# Altium footprint library Connectors.PcbLib: 268 footprints (part 3 of 21)
Each footprint in its own frame and in the unit in brackets; x right, y up, seen from the top. Pads: shape width x height; smd on the part's side, far side on the other; paste and mask are expansions set on the pad; w line width, h text height; cw(c..) or ccw(c..) is an arc to the next point about the centre after c.
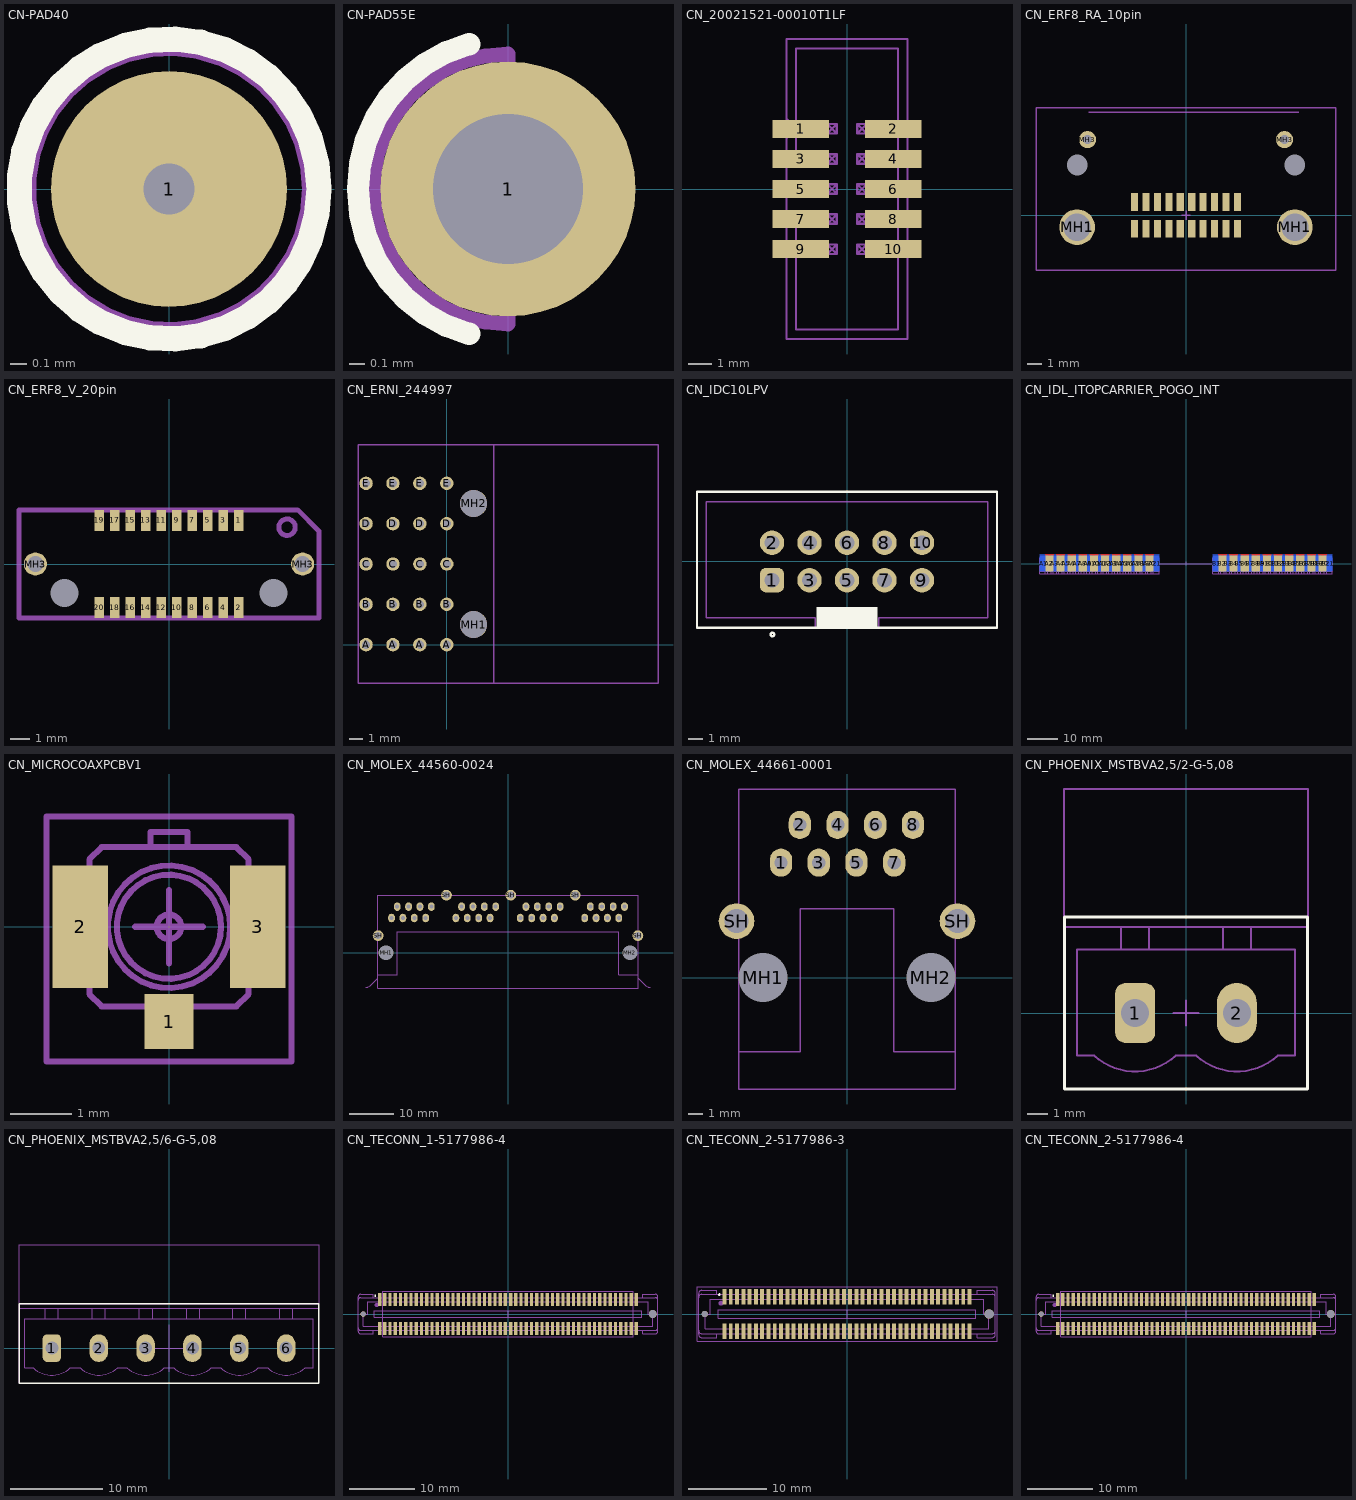
[diagram p2: the footprints below, top view; thin cyan lines are the x and y axes]

## CN-PAD40 [mil] "Connector pad 1.0mm with via 0.3mm"
pads (1):
  round 55 smd paste-100: 1(0,0)
via 0,0 diameter 23.62 hole 11.81
Top Overlay:
  circle w5.91: c0,0 r35
Mechanical 13:
  circle w3.94: c0,0 r33
Mechanical 15:
  lines w4: -19.68,0 19.68,0 ; 0,-19.68 0,19.68

## CN-PAD55E [mm] "Connector pad 1.4mm"
pads (1):
  round 1.7 / inner round 1.4 / far side round 1.4 hole 1: 1(0,0)
Top Overlay:
  lines w0.15: -0.259,-0.966 cw(c0,0) -0.259,0.966
Mechanical 13:
  lines w0.1: 0,-0.9 cw(c0,0) 0,0.9
  lines w0.102: 0,-0.9 0,0.9
Mechanical 15:
  lines w0.102: -0.5,0 0.5,0 ; 0,-0.5 0,0.5

## CN_20021521-00010T1LF [mm] "Pin header 2x5 pin R1.27mm"
height 5.4
pads (10):
  rect 2.4x0.76 smd: 1(-1.95,2.54) 2(1.95,2.54) 3(-1.95,1.27) 4(1.95,1.27) 5(-1.95,0) 6(1.95,0) 7(-1.95,-1.27) 8(1.95,-1.27) 9(-1.95,-2.54) 10(1.95,-2.54)
Mechanical 13:
  lines w0.1: -2.55,-1.2 -2.15,-1.2 -2.15,-5.925 2.15,-5.925 2.15,5.925 -2.15,5.925 -2.15,1.2 -2.55,1.2 ; -2.55,2.95 -2.15,2.55 -2.538,2.163 ; -0.835,-2.74 -0.835,-2.34 ; -0.835,-2.74 -0.435,-2.74 ; -0.835,-2.74 -0.435,-2.34 ; -0.835,-2.34 -0.435,-2.34 ; -0.835,-2.34 -0.435,-2.74 ; -0.835,-1.47 -0.835,-1.07 ; -0.835,-1.47 -0.435,-1.47 ; -0.835,-1.47 -0.435,-1.07 ; -0.835,-1.07 -0.435,-1.07 ; -0.835,-1.07 -0.435,-1.47 ; -0.835,-0.2 -0.435,0.2 ; -0.835,-0.2 -0.435,-0.2 ; -0.835,-0.2 -0.835,0.2 ; -0.835,0.2 -0.435,-0.2 ; -0.835,0.2 -0.435,0.2 ; -0.835,1.07 -0.835,1.47 ; -0.835,1.07 -0.435,1.07 ; -0.835,1.07 -0.435,1.47 ; -0.835,1.47 -0.435,1.47 ; -0.835,1.47 -0.435,1.07 ; -0.835,2.34 -0.835,2.74 ; -0.835,2.34 -0.435,2.34 ; -0.835,2.34 -0.435,2.74 ; -0.835,2.74 -0.435,2.74 ; -0.835,2.74 -0.435,2.34 ; -0.435,-2.74 -0.435,-2.34 ; -0.435,-1.47 -0.435,-1.07 ; -0.435,-0.2 -0.435,0.2 ; -0.435,1.07 -0.435,1.47 ; -0.435,2.34 -0.435,2.74 ; 0.435,-2.74 0.835,-2.74 ; 0.435,-2.74 0.435,-2.34 ; 0.435,-2.74 0.835,-2.34 ; 0.435,-2.34 0.835,-2.34 ; 0.435,-2.34 0.835,-2.74 ; 0.435,-1.47 0.835,-1.47 ; 0.435,-1.47 0.435,-1.07 ; 0.435,-1.47 0.835,-1.07 ; 0.435,-1.07 0.835,-1.07 ; 0.435,-1.07 0.835,-1.47 ; 0.435,-0.2 0.835,-0.2 ; 0.435,-0.2 0.435,0.2 ; 0.435,-0.2 0.835,0.2 ; 0.435,0.2 0.835,0.2 ; 0.435,0.2 0.835,-0.2 ; 0.435,1.07 0.835,1.07 ; 0.435,1.07 0.435,1.47 ; 0.435,1.07 0.835,1.47 ; 0.435,1.47 0.835,1.47 ; 0.435,1.47 0.835,1.07 ; 0.435,2.34 0.835,2.34 ; 0.435,2.34 0.435,2.74 ; 0.435,2.34 0.835,2.74 ; 0.435,2.74 0.835,2.74 ; 0.435,2.74 0.835,2.34 ; 0.835,-2.74 0.835,-2.34 ; 0.835,-1.47 0.835,-1.07 ; 0.835,-0.2 0.835,0.2 ; 0.835,1.07 0.835,1.47 ; 0.835,2.34 0.835,2.74 ; -2.55,-6.325 -2.55,6.325 2.55,6.325 2.55,-6.325 -2.55,-6.325
3D body: height 0.4, standoff 0, extent 2.55,2.34 2.75,2.74
3D body: height 0.4, standoff 0, extent 2.55,1.07 2.75,1.47
3D body: height 0.4, standoff 0, extent 2.55,-0.2 2.75,0.2
3D body: height 0.4, standoff 0, extent 2.55,-1.47 2.75,-1.07
3D body: height 0.4, standoff 0, extent 2.55,-2.74 2.75,-2.34
3D body: height 0.4, standoff 0, extent -2.75,-2.74 -2.55,-2.34
3D body: height 0.4, standoff 0, extent -2.75,-1.47 -2.55,-1.07
3D body: height 0.4, standoff 0, extent -2.75,-0.2 -2.55,0.2
3D body: height 0.4, standoff 0, extent -2.75,1.07 -2.55,1.47
3D body: height 0.4, standoff 0, extent -2.75,2.34 -2.55,2.74
3D body: height 4.5, standoff 1.5, extent 0.435,-2.74 0.835,-2.34
3D body: height 4.5, standoff 1.5, extent -0.845,-2.75 -0.445,-2.35
3D body: height 4.5, standoff 1.5, extent -0.835,-1.47 -0.435,-1.07
3D body: height 4.5, standoff 1.5, extent 0.435,-1.47 0.835,-1.07
3D body: height 4.5, standoff 1.5, extent 0.435,-0.2 0.835,0.2
3D body: height 4.5, standoff 1.5, extent -0.835,-0.2 -0.435,0.2
3D body: height 4.5, standoff 1.5, extent -0.835,1.07 -0.435,1.47
3D body: height 4.5, standoff 1.5, extent 0.435,1.07 0.835,1.47
3D body: height 4.5, standoff 1.5, extent 0.435,2.34 0.835,2.74
3D body: height 4.5, standoff 1.5, extent -0.835,2.34 -0.435,2.74
3D body: height 5.6, standoff 1.5, extent -2.55,-6.325 2.55,6.325
3D body: height 1.5, standoff 0.1, extent -2.55,-6.325 2.55,6.325

## CN_ERF8_RA_10pin [mm] "Connector Samtec Multicoax ERF8 SMD Rigth Angle"
height 9.45
pads (26):
  rect 0.5x1.25 smd: 1(3.6,0.94) 2(3.6,-0.94) 3(2.8,0.94) 4(2.8,-0.94) 5(2,0.94) 6(2,-0.94) 7(1.2,0.94) 8(1.2,-0.94) 9(0.4,0.94) 10(0.4,-0.94) 11(-0.4,0.94) 12(-0.4,-0.94) 13(-1.2,0.94) 14(-1.2,-0.94) 15(-2,0.94) 16(-2,-0.94) 17(-2.8,0.94) 18(-2.8,-0.94) 19(-3.6,0.94) 20(-3.6,-0.94)
  round 2.5 hole 1.905: MH1(-7.625,-0.835) MH1(7.625,-0.835)
  round 0 hole 1.45 unplated: MH2(-7.625,3.515) MH2(7.625,3.515)
  round 1.2 hole 0.63: MH3(-6.9,5.295) MH3(6.9,5.295)
Mechanical 13:
  lines w0.102: -10.505,-3.83 -10.505,7.515 10.505,7.515 10.505,-3.83 10.5,-3.835 -10.5,-3.835 -10.505,-3.83
Mechanical 15:
  lines w0.102: -6.8,7.215 7.9,7.215 ; -0.3,0 0.3,0 ; 0,-0.3 0,0.3
3D body "ERF8-010-01-X-D-RA.step": height 6.26, standoff -1.54, extent -10.5,-3.835 10.5,7.515

## CN_ERF8_V_20pin [mm] "ERF8-010-05.0-L-DV-L-TR"
pads (24):
  rect 0.5x1.1 smd: 1(3.6,2.25) 2(3.6,-2.25) 3(2.8,2.25) 4(2.8,-2.25) 5(2,2.25) 6(2,-2.25) 7(1.2,2.25) 8(1.2,-2.25) 9(0.4,2.25) 10(0.4,-2.25) 11(-0.4,2.25) 12(-0.4,-2.25) 13(-1.2,2.25) 14(-1.2,-2.25) 15(-2,2.25) 16(-2,-2.25) 17(-2.8,2.25) 18(-2.8,-2.25) 19(-3.6,2.25) 20(-3.6,-2.25)
  round 0 hole 1.45 unplated: MH1(-5.4,-1.5) MH1(5.4,-1.5)
  round 1.2 hole 0.83: MH3(-6.9,0) MH3(6.9,0)
Mechanical 13:
  circle w0.254: c6.1,1.9 r0.424
  lines w0.254: -7.75,-2.8 -7.75,2.8 6.65,2.8 7.75,1.7 7.75,-2.8 -7.75,-2.8
3D body "ERF8-010-05.0-X-DV-L.step": height 5.11, standoff -1.26, extent -7.75,-2.8 7.75,2.8

## CN_ERNI_244997 [mm] "CN power 5pin 22.3x17.7x14.3mm"
height 9.7
pads (22):
  round 1 hole 0.6: A(-6,0) A(-4,0) A(-2,0) A(0,0) B(-6,3) B(-4,3) B(-2,3) B(0,3) C(-6,6) C(-4,6) C(-2,6) C(0,6) D(-6,9) D(-4,9) D(-2,9) D(0,9) E(-6,12) E(-4,12) E(-2,12) E(0,12)
  round 2 hole 2 unplated: MH1(2,1.5) MH2(2,10.5)
Mechanical 13:
  lines w0.1: -6.6,-2.85 -6.6,14.85 15.7,14.85 15.7,-2.85 -6.6,-2.85
Mechanical 15:
  lines w0.1: 3.5,-2.85 3.5,14.85
3D body "244997.STEP": height 9.72, standoff -4.58, extent -6.6,-2.85 15.7,14.85

## CN_IDC10LPV [mm] "Connector IDC Low Profile Male Header, Thru-Hole; 10 pin; Vertical; R2.54 mm; Body 20.32 x 9.2 x 9.45 mm (LxWxH)"
height 9.45
pads (10):
  rrect50% 1.65x1.65 hole 1: 1(-5.08,-1.27)
  round 1.65 hole 1: 2(-5.08,1.27) 3(-2.54,-1.27) 4(-2.54,1.27) 5(0,-1.27) 6(0,1.27) 7(2.54,-1.27) 8(2.54,1.27) 9(5.08,-1.27) 10(5.08,1.27)
Top Overlay:
  circle w0.15: c-5.055,-4.945 r0.125
  rectangle: -2.05,-4.498 2.05,-3.073
  lines w0.15: -10.16,-4.493 -10.16,4.722 10.16,4.722 10.16,-4.493 -10.16,-4.493
Mechanical 13:
  lines w0.102: -2.159,-4.491 -2.159,-3.83 -9.525,-3.83 -9.525,4.059 9.525,4.059 9.525,-3.83 2.159,-3.83 2.159,-4.491 ; -10.16,-4.491 10.16,-4.491 10.16,4.719 -10.16,4.719 -10.16,-4.491
  text "9" at 6.28,-2.02 h1.5
  text "10" at 6.28,0.52 h1.5
  text "1" at -6.78,-2.02 h1.5
  text "2" at -7.28,0.52 h1.5
3D body "0918_SEK_low_profile_male_header_straight_10-pin_2_9_PCB.stp": height 9.4, standoff -3.25, extent -10.16,-4.45 10.16,4.75

## CN_IDL_ITOPCARRIER_POGO_INT [mil] "Pogo pis Female interface"
height 54
pads (42):
  rect 105x200 smd far side: A1(-1811.02,0) A3(-1669.29,0) A5(-1527.56,0) A7(-1385.82,0) A9(-1244.09,0) A11(-1102.36,0) A13(-960.63,0) A15(-818.9,0) A17(-677.16,0) A19(-535.43,0) A21(-393.7,0) B1(393.7,0) B3(535.43,0) B5(677.16,0) B7(818.9,0) B9(960.63,0) B11(1102.36,0) B13(1244.09,0) B15(1385.82,0) B17(1527.56,0) B19(1669.29,0) B21(1811.02,0)
  rect 105x200 smd: A2(-1740.15,0) A4(-1598.42,0) A6(-1456.69,0) A8(-1314.96,0) A10(-1173.23,0) A12(-1031.49,0) A14(-889.76,0) A16(-748.03,0) A18(-606.3,0) A20(-464.56,0) B2(464.57,0) B4(606.3,0) B6(748.03,0) B8(889.76,0) B10(1031.5,0) B12(1173.23,0) B14(1314.96,0) B16(1456.69,0) B18(1598.43,0) B20(1740.16,0)
Top Layer:
  region: 1687.66,100 1687.66,119.69 1792.66,119.69 1792.66,100
  region: 1545.92,100 1545.92,119.69 1650.92,119.69 1650.92,100
  region: 1404.19,100 1404.19,119.69 1509.19,119.69 1509.19,100
  region: 1262.46,100 1262.46,119.69 1367.46,119.69 1367.46,100
  region: 1120.73,100 1120.73,119.69 1225.73,119.69 1225.73,100
  region: 979,100 979,119.69 1084,119.69 1084,100
  region: 837.26,100 837.26,119.69 942.26,119.69 942.26,100
  region: 695.53,100 695.53,119.69 800.53,119.69 800.53,100
  region: 553.8,100 553.8,119.69 658.8,119.69 658.8,100
  region: 412.07,100 412.07,119.69 517.07,119.69 517.07,100
  region: -517.06,100 -517.06,119.69 -412.06,119.69 -412.06,100
  region: -658.8,100 -658.8,119.69 -553.8,119.69 -553.8,100
  region: -800.53,100 -800.53,119.69 -695.53,119.69 -695.53,100
  region: -942.26,100 -942.26,119.69 -837.26,119.69 -837.26,100
  region: -1083.99,100 -1083.99,119.69 -978.99,119.69 -978.99,100
  region: -1225.73,100 -1225.73,119.69 -1120.73,119.69 -1120.73,100
  region: -1367.46,100 -1367.46,119.69 -1262.46,119.69 -1262.46,100
  region: -1509.19,100 -1509.19,119.69 -1404.19,119.69 -1404.19,100
  region: -1650.92,100 -1650.92,119.69 -1545.92,119.69 -1545.92,100
  region: -1792.65,100 -1792.65,119.69 -1687.65,119.69 -1687.65,100
Bottom Layer:
  region: 1863.52,100 1863.52,119.69 1758.52,119.69 1758.52,100
  region: 1721.79,100 1721.79,119.69 1616.79,119.69 1616.79,100
  region: 1580.06,100 1580.06,119.69 1475.06,119.69 1475.06,100
  region: 1438.33,100 1438.33,119.69 1333.33,119.69 1333.33,100
  region: 1296.59,100 1296.59,119.69 1191.59,119.69 1191.59,100
  region: 1154.86,100 1154.86,119.69 1049.86,119.69 1049.86,100
  region: 1013.13,100 1013.13,119.69 908.13,119.69 908.13,100
  region: 871.4,100 871.4,119.69 766.4,119.69 766.4,100
  region: 729.67,100 729.67,119.69 624.67,119.69 624.67,100
  region: 587.93,100 587.93,119.69 482.93,119.69 482.93,100
  region: 446.2,100 446.2,119.69 341.2,119.69 341.2,100
  region: -341.2,100 -341.2,119.69 -446.2,119.69 -446.2,100
  region: -482.93,100 -482.93,119.69 -587.93,119.69 -587.93,100
  region: -624.66,100 -624.66,119.69 -729.66,119.69 -729.66,100
  region: -766.4,100 -766.4,119.69 -871.4,119.69 -871.4,100
  region: -908.13,100 -908.13,119.69 -1013.13,119.69 -1013.13,100
  region: -1049.86,100 -1049.86,119.69 -1154.86,119.69 -1154.86,100
  region: -1191.59,100 -1191.59,119.69 -1296.59,119.69 -1296.59,100
  region: -1333.32,100 -1333.32,119.69 -1438.32,119.69 -1438.32,100
  region: -1475.06,100 -1475.06,119.69 -1580.06,119.69 -1580.06,100
  region: -1616.79,100 -1616.79,119.69 -1721.79,119.69 -1721.79,100
  region: -1758.52,100 -1758.52,119.69 -1863.52,119.69 -1863.52,100
Mechanical 13:
  lines w4: -1790,-100 -1690,-100 ; -1648.27,-100 -1548.27,-100 ; -1506.54,-100 -1406.54,-100 ; -1364.8,-100 -1264.8,-100 ; -1223.07,-100 -1123.07,-100 ; -1081.34,-100 -981.34,-100 ; -939.61,-100 -839.61,-100 ; -797.87,-100 -697.87,-100 ; -656.14,-100 -556.14,-100 ; -514.41,-100 -414.41,-100 ; 414.72,-100 514.72,-100 ; 556.45,-100 656.45,-100 ; 698.19,-100 798.19,-100 ; 839.92,-100 939.92,-100 ; 981.65,-100 1081.65,-100 ; 1123.38,-100 1223.38,-100 ; 1265.12,-100 1365.12,-100 ; 1406.85,-100 1506.85,-100 ; 1548.58,-100 1648.58,-100 ; 1690.31,-100 1790.31,-100 ; -1790,-130 -1790,76 -1690,76 -1690,-130 -1790,-130 ; -1648.27,-130 -1548.27,-130 -1548.27,76 -1648.27,76 -1648.27,-130 ; -1506.54,-130 -1406.54,-130 -1406.54,76 -1506.54,76 -1506.54,-130 ; -1364.8,-130 -1264.8,-130 -1264.8,76 -1364.8,76 -1364.8,-130 ; -1223.07,-130 -1123.07,-130 -1123.07,76 -1223.07,76 -1223.07,-130 ; -1081.34,-130 -981.34,-130 -981.34,76 -1081.34,76 -1081.34,-130 ; -939.61,-130 -839.61,-130 -839.61,76 -939.61,76 -939.61,-130 ; -797.87,-130 -697.87,-130 -697.87,76 -797.87,76 -797.87,-130 ; -656.14,-130 -556.14,-130 -556.14,76 -656.14,76 -656.14,-130 ; -514.41,-130 -414.41,-130 -414.41,76 -514.41,76 -514.41,-130 ; 414.72,-130 514.72,-130 514.72,76 414.72,76 414.72,-130 ; 556.45,-130 656.45,-130 656.45,76 556.45,76 556.45,-130 ; 698.19,-130 798.19,-130 798.19,76 698.19,76 698.19,-130 ; 839.92,-130 939.92,-130 939.92,76 839.92,76 839.92,-130 ; 981.65,-130 1081.65,-130 1081.65,76 981.65,76 981.65,-130 ; 1123.38,-130 1223.38,-130 1223.38,76 1123.38,76 1123.38,-130 ; 1265.12,-130 1365.12,-130 1365.12,76 1265.12,76 1265.12,-130 ; 1406.85,-130 1506.85,-130 1506.85,76 1406.85,76 1406.85,-130 ; 1548.58,-130 1648.58,-130 1648.58,76 1548.58,76 1548.58,-130 ; 1690.31,-130 1790.31,-130 1790.31,76 1690.31,76 1690.31,-130
Mechanical 14:
  lines w4: -1860.87,-100 -1760.87,-100 ; -1719.13,-100 -1619.13,-100 ; -1577.4,-100 -1477.4,-100 ; -1435.67,-100 -1335.67,-100 ; -1293.94,-100 -1193.94,-100 ; -1152.21,-100 -1052.21,-100 ; -1010.47,-100 -910.47,-100 ; -868.74,-100 -768.74,-100 ; -727.01,-100 -627.01,-100 ; -585.28,-100 -485.28,-100 ; -443.55,-100 -343.55,-100 ; 343.86,-100 443.86,-100 ; 485.59,-100 585.59,-100 ; 627.32,-100 727.32,-100 ; 769.05,-100 869.05,-100 ; 910.78,-100 1010.78,-100 ; 1052.52,-100 1152.52,-100 ; 1194.25,-100 1294.25,-100 ; 1335.98,-100 1435.98,-100 ; 1477.71,-100 1577.71,-100 ; 1619.44,-100 1719.44,-100 ; 1761.18,-100 1861.18,-100 ; -1860.87,-130 -1760.87,-130 -1760.87,76 -1860.87,76 -1860.87,-130 ; -1719.13,-130 -1719.13,76 -1619.13,76 -1619.13,-130 -1719.13,-130 ; -1577.4,-130 -1577.4,76 -1477.4,76 -1477.4,-130 -1577.4,-130 ; -1435.67,-130 -1435.67,76 -1335.67,76 -1335.67,-130 -1435.67,-130 ; -1293.94,-130 -1293.94,76 -1193.94,76 -1193.94,-130 -1293.94,-130 ; -1152.21,-130 -1152.21,76 -1052.21,76 -1052.21,-130 -1152.21,-130 ; -1010.47,-130 -1010.47,76 -910.47,76 -910.47,-130 -1010.47,-130 ; -868.74,-130 -868.74,76 -768.74,76 -768.74,-130 -868.74,-130 ; -727.01,-130 -727.01,76 -627.01,76 -627.01,-130 -727.01,-130 ; -585.28,-130 -585.28,76 -485.28,76 -485.28,-130 -585.28,-130 ; -443.55,-130 -443.55,76 -343.55,76 -343.55,-130 -443.55,-130 ; 343.86,-130 343.86,76 443.86,76 443.86,-130 343.86,-130 ; 485.59,-130 485.59,76 585.59,76 585.59,-130 485.59,-130 ; 627.32,-130 627.32,76 727.32,76 727.32,-130 627.32,-130 ; 769.05,-130 769.05,76 869.05,76 869.05,-130 769.05,-130 ; 910.78,-130 910.78,76 1010.78,76 1010.78,-130 910.78,-130 ; 1052.52,-130 1052.52,76 1152.52,76 1152.52,-130 1052.52,-130 ; 1194.25,-130 1194.25,76 1294.25,76 1294.25,-130 1194.25,-130 ; 1335.98,-130 1335.98,76 1435.98,76 1435.98,-130 1335.98,-130 ; 1477.71,-130 1477.71,76 1577.71,76 1577.71,-130 1477.71,-130 ; 1619.44,-130 1619.44,76 1719.44,76 1719.44,-130 1619.44,-130 ; 1761.18,-130 1761.18,76 1861.18,76 1861.18,-130 1761.18,-130
Mechanical 15:
  lines w4: -393.7,0 393.7,0 ; 0,-21 0,0 0,21
3D body "mill-max-7937-0-00-15-00-00-03-0.step": height 123, standoff -32, extent -1790,-130 -1690,76
3D body "mill-max-7937-0-00-15-00-00-03-0.step": height 123, standoff -32, extent -1648.26,-130 -1548.26,76
3D body "mill-max-7937-0-00-15-00-00-03-0.step": height 123, standoff -32, extent -1506.53,-130 -1406.53,76
3D body "mill-max-7937-0-00-15-00-00-03-0.step": height 123, standoff -32, extent -1364.8,-130 -1264.8,76
3D body "mill-max-7937-0-00-15-00-00-03-0.step": height 123, standoff -32, extent -1223.07,-130 -1123.07,76
3D body "mill-max-7937-0-00-15-00-00-03-0.step": height 123, standoff -32, extent -1081.33,-130 -981.33,76
3D body "mill-max-7937-0-00-15-00-00-03-0.step": height 123, standoff -32, extent -939.6,-130 -839.6,76
3D body "mill-max-7937-0-00-15-00-00-03-0.step": height 123, standoff -32, extent -797.87,-130 -697.87,76
3D body "mill-max-7937-0-00-15-00-00-03-0.step": height 123, standoff -32, extent -656.14,-130 -556.14,76
3D body "mill-max-7937-0-00-15-00-00-03-0.step": height 123, standoff -32, extent -514.4,-130 -414.4,76
3D body "mill-max-7937-0-00-15-00-00-03-0.step": height 123, standoff -32, extent 414.73,-130 514.73,76
3D body "mill-max-7937-0-00-15-00-00-03-0.step": height 123, standoff -32, extent 556.46,-130 656.46,76
3D body "mill-max-7937-0-00-15-00-00-03-0.step": height 123, standoff -32, extent 698.19,-130 798.19,76
3D body "mill-max-7937-0-00-15-00-00-03-0.step": height 123, standoff -32, extent 839.92,-130 939.92,76
3D body "mill-max-7937-0-00-15-00-00-03-0.step": height 123, standoff -32, extent 981.66,-130 1081.66,76
3D body "mill-max-7937-0-00-15-00-00-03-0.step": height 123, standoff -32, extent 1123.39,-130 1223.39,76
3D body "mill-max-7937-0-00-15-00-00-03-0.step": height 123, standoff -32, extent 1265.12,-130 1365.12,76
3D body "mill-max-7937-0-00-15-00-00-03-0.step": height 123, standoff -32, extent 1406.85,-130 1506.85,76
3D body "mill-max-7937-0-00-15-00-00-03-0.step": height 123, standoff -32, extent 1548.58,-130 1648.58,76
3D body "mill-max-7937-0-00-15-00-00-03-0.step": height 123, standoff -32, extent 1690.32,-130 1790.32,76
3D body "mill-max-7937-0-00-15-00-00-03-0.step": height 123, standoff -32, extent -1860.87,-130 -1760.87,76
3D body "mill-max-7937-0-00-15-00-00-03-0.step": height 123, standoff -32, extent -1719.13,-130 -1619.13,76
3D body "mill-max-7937-0-00-15-00-00-03-0.step": height 123, standoff -32, extent -1577.4,-130 -1477.4,76
3D body "mill-max-7937-0-00-15-00-00-03-0.step": height 123, standoff -32, extent -1435.67,-130 -1335.67,76
3D body "mill-max-7937-0-00-15-00-00-03-0.step": height 123, standoff -32, extent -1293.94,-130 -1193.94,76
3D body "mill-max-7937-0-00-15-00-00-03-0.step": height 123, standoff -32, extent -1152.21,-130 -1052.21,76
3D body "mill-max-7937-0-00-15-00-00-03-0.step": height 123, standoff -32, extent -1010.47,-130 -910.47,76
3D body "mill-max-7937-0-00-15-00-00-03-0.step": height 123, standoff -32, extent -868.74,-130 -768.74,76
3D body "mill-max-7937-0-00-15-00-00-03-0.step": height 123, standoff -32, extent -727.01,-130 -627.01,76
3D body "mill-max-7937-0-00-15-00-00-03-0.step": height 123, standoff -32, extent -585.28,-130 -485.28,76
3D body "mill-max-7937-0-00-15-00-00-03-0.step": height 123, standoff -32, extent -443.55,-130 -343.55,76
3D body "mill-max-7937-0-00-15-00-00-03-0.step": height 123, standoff -32, extent 343.86,-130 443.86,76
3D body "mill-max-7937-0-00-15-00-00-03-0.step": height 123, standoff -32, extent 485.59,-130 585.59,76
3D body "mill-max-7937-0-00-15-00-00-03-0.step": height 123, standoff -32, extent 627.32,-130 727.32,76
3D body "mill-max-7937-0-00-15-00-00-03-0.step": height 123, standoff -32, extent 769.05,-130 869.05,76
3D body "mill-max-7937-0-00-15-00-00-03-0.step": height 123, standoff -32, extent 910.78,-130 1010.78,76
3D body "mill-max-7937-0-00-15-00-00-03-0.step": height 123, standoff -32, extent 1052.52,-130 1152.52,76
3D body "mill-max-7937-0-00-15-00-00-03-0.step": height 123, standoff -32, extent 1194.25,-130 1294.25,76
3D body "mill-max-7937-0-00-15-00-00-03-0.step": height 123, standoff -32, extent 1335.98,-130 1435.98,76
3D body "mill-max-7937-0-00-15-00-00-03-0.step": height 123, standoff -32, extent 1477.71,-130 1577.71,76
3D body "mill-max-7937-0-00-15-00-00-03-0.step": height 123, standoff -32, extent 1619.44,-130 1719.44,76
3D body "mill-max-7937-0-00-15-00-00-03-0.step": height 123, standoff -32, extent 1761.18,-130 1861.18,76

## CN_MICROCOAXPCBV1 [mm] "Micro coax pcb connector SMD"
height 2
pads (3):
  rect 0.8x0.9 smd: 1(0,-1.55)
  rect 0.9x2 smd: 2(-1.45,0) 3(1.45,0)
Mechanical 13:
  circle w0.1: c0,0 r0.2
  circle w0.1: c0,0 r1
  circle w0.1: c0,0 r0.85
  lines w0.1: -1.3,-0.9 -1.5,-0.9 -1.5,0.9 -1.3,0.9 ; -0.3,-1.3 -0.3,-1.55 0.3,-1.55 0.3,-1.3 ; -0.3,1.3 -0.3,1.55 0.3,1.55 0.3,1.3 ; 1.3,-0.9 1.5,-0.9 1.5,0.9 1.3,0.9 ; -1.3,-1.1 -1.3,1.1 -1.1,1.3 1.1,1.3 1.3,1.1 1.3,-1.1 1.1,-1.3 -1.1,-1.3 -1.3,-1.1
Mechanical 15:
  lines w0.102: -0.55,0 0.55,0 ; 0,-0.6 0,0.6 ; -2,-2.2 2,-2.2 2,1.8 -2,1.8 -2,-2.2
3D body: height 0.18, standoff 0, extent 1.3,-0.9 1.5,0.9
3D body: height 0.18, standoff 0, extent -1.5,-0.9 -1.3,0.9
3D body: height 1.25, standoff 0.35, extent -0.2,-0.2 0.2,0.2
3D body: height 1.25, standoff 0.35, extent -1,-1 1,1
3D body: height 0.35, standoff 0, extent -1.3,-1.3 1.3,1.3
3D body: height 0.18, standoff 0, extent -0.3,-1.55 0.3,-1.3
3D body: height 0.53, standoff 0.35, extent -0.3,0.95 0.3,1.55

## CN_MOLEX_44560-0024 [mm] "Connector RJ45 for AMC 8pin pressfit 15.75x16.3x13.97"
height 7.38
pads (39):
  oval 1.5x1.9 hole 0.9: A1(-26.005,7.75) A2(-24.735,10.29) A3(-23.465,7.75) A4(-22.195,10.29) A5(-20.925,7.75) A6(-19.655,10.29) A7(-18.385,7.75) A8(-17.115,10.29) B1(-11.63,7.75) B2(-10.36,10.29) B3(-9.09,7.75) B4(-7.82,10.29) B5(-6.55,7.75) B6(-5.28,10.29) B7(-4.01,7.75) B8(-2.74,10.29) C1(2.745,7.75) C2(4.015,10.29) C3(5.285,7.75) C4(6.555,10.29) C5(7.825,7.75) C6(9.095,10.29) C7(10.365,7.75) C8(11.635,10.29) D1(17.12,7.75) D2(18.39,10.29) D3(19.66,7.75) D4(20.93,10.29) D5(22.2,7.75) D6(23.47,10.29) D7(24.74,7.75) D8(26.01,10.29)
  round 3 hole 3.3 unplated: MH1(-27.215,0) MH2(27.215,0)
  round 2.4 hole 1.6: SH(-29.005,3.81) SH(-13.745,12.85) SH(0.635,12.85) SH(15.015,12.85) SH(29.005,3.81)
Mechanical 13:
  lines w0.1: -31.8,-7.75 ccw(c-31.8,-6.06) -30.605,-7.255 -29.1,-5.75 ; 29.1,-5.75 30.605,-7.255 ccw(c31.8,-6.06) 31.8,-7.75 ; -29.1,-7.925 -29.1,12.85 29.1,12.85 29.1,-7.925 -29.1,-7.925
Mechanical 15:
  lines w0.1: -29.1,-4.975 -24.715,-4.975 -24.715,4.65 24.71,4.65 24.71,-4.975 29.1,-4.975
3D body "445600024.stp": height 9.55, standoff -3.29, extent -30.442,-7.75 30.442,13.15

## CN_MOLEX_44661-0001 [mm] "Connector RJ45 low profile"
height 7.38
pads (12):
  oval 1.5x1.9 hole 0.9: 1(-4.445,7.75) 2(-3.175,10.29) 3(-1.905,7.75) 4(-0.635,10.29) 5(0.635,7.75) 6(1.905,10.29) 7(3.175,7.75) 8(4.445,10.29)
  round 3 hole 3.3 unplated: MH1(-5.65,0) MH2(5.65,0)
  round 2.4 hole 1.6: SH(-7.44,3.81) SH(7.44,3.81)
Mechanical 13:
  lines w0.1: -7.3,-7.5 7.3,-7.5 7.3,12.71 -7.3,12.71 -7.3,-7.5
Mechanical 15:
  lines w0.1: -7.3,-4.975 -3.15,-4.975 -3.15,4.65 3.15,4.65 3.15,-4.975 7.3,-4.975
3D body "446610001.stp": height 9.55, standoff -3.28, extent -7.82,-7.745 7.82,13.035

## CN_PHOENIX_MSTBVA2,5/2-G-5,08 [mm] "MSTBVA2,5/2-G-5,08  2pin vertical"
height 0.8
pads (2):
  rrect50% 2x3 hole 1.4: 1(-2.54,0)
  oval 2x3 hole 1.4: 2(2.54,0)
Top Overlay:
  lines w0.15: -6.08,-3.8 6.08,-3.8 6.08,4.8 -6.08,4.8 -6.08,-3.8
Mechanical 13:
  lines w0.1: -6.1,4.3 6.096,4.3 ; -5.461,-2.125 -4.582,-2.125 ; -4.582,-2.132 ccw(c-2.55,0.075) -0.518,-2.132 ; -3.25,3.175 -3.25,4.3 ; -1.85,3.175 -1.85,4.3 ; -0.518,-2.125 0.518,-2.125 ; 0.518,-2.132 ccw(c2.55,0.075) 4.582,-2.132 ; 1.85,3.175 1.85,4.3 ; 3.25,3.175 3.25,4.3 ; 4.582,-2.125 5.461,-2.125 ; -3.04,-0.5 -2.04,-0.5 -2.04,0.5 -3.04,0.5 -3.04,-0.5 ; 2.04,-0.5 3.04,-0.5 3.04,0.5 2.04,0.5 2.04,-0.5
  lines w0.102: -5.461,-2.125 -5.461,3.175 5.461,3.175 5.461,-2.125 ; -6.08,-3.8 -6.08,4.8 6.08,4.8 6.08,-3.8 -6.08,-3.8
Mechanical 15:
  lines w0.1: -6.1,4.82 -6.1,11.2 6.1,11.2 6.1,4.82
  lines w0.102: -0.635,0 0.635,0 ; 0,-0.635 0,0.635
3D body "1755736.stp": height 12.02, standoff -3.88, extent -6.08,-3.8 6.08,4.8

## CN_PHOENIX_MSTBVA2,5/6-G-5,08 [mm] "MSTBVA2,5/6-G-5,08  6pin vertical"
height 0.8
pads (6):
  rrect50% 2x3 hole 1.4: 1(-12.7,0)
  oval 2x3 hole 1.4: 2(-7.62,0) 3(-2.54,0) 4(2.54,0) 5(7.62,0) 6(12.7,0)
Top Overlay:
  lines w0.15: -16.256,-3.8 -16.256,4.8 16.256,4.8 16.256,-3.8 -16.256,-3.8
Mechanical 13:
  lines w0.1: -16.26,4.3 16.24,4.3 ; -15.621,-2.125 -14.742,-2.125 ; -14.742,-2.132 ccw(c-12.71,0.075) -10.678,-2.132 ; -13.41,3.175 -13.41,4.3 ; -12.01,3.175 -12.01,4.3 ; -10.678,-2.125 -9.642,-2.125 ; -9.642,-2.132 ccw(c-7.61,0.075) -5.578,-2.132 ; -8.31,3.175 -8.31,4.3 ; -6.91,3.175 -6.91,4.3 ; -5.598,-2.125 -4.562,-2.125 ; -4.562,-2.132 ccw(c-2.53,0.075) -0.498,-2.132 ; -3.23,3.175 -3.23,4.3 ; -1.83,3.175 -1.83,4.3 ; -0.518,-2.125 0.518,-2.125 ; 0.518,-2.132 ccw(c2.55,0.075) 4.582,-2.132 ; 1.85,3.175 1.85,4.3 ; 3.25,3.175 3.25,4.3 ; 4.562,-2.125 5.598,-2.125 ; 5.598,-2.132 ccw(c7.63,0.075) 9.662,-2.132 ; 6.93,3.175 6.93,4.3 ; 8.33,3.175 8.33,4.3 ; 9.642,-2.125 10.678,-2.125 ; 10.678,-2.132 ccw(c12.71,0.075) 14.742,-2.132 ; 12.01,3.175 12.01,4.3 ; 13.41,3.175 13.41,4.3 ; 14.742,-2.125 15.621,-2.125 ; -13.2,-0.5 -13.2,0.5 -12.2,0.5 -12.2,-0.5 -13.2,-0.5 ; -8.12,-0.5 -8.12,0.5 -7.12,0.5 -7.12,-0.5 -8.12,-0.5 ; -3.04,-0.5 -2.04,-0.5 -2.04,0.5 -3.04,0.5 -3.04,-0.5 ; 2.04,-0.5 2.04,0.5 3.04,0.5 3.04,-0.5 2.04,-0.5 ; 7.12,-0.5 8.12,-0.5 8.12,0.5 7.12,0.5 7.12,-0.5 ; 12.2,-0.5 12.2,0.5 13.2,0.5 13.2,-0.5 12.2,-0.5
  lines w0.102: -15.621,-2.125 -15.621,3.175 15.621,3.175 15.621,-2.125 ; -16.24,-3.8 16.24,-3.8 16.24,4.8 -16.24,4.8 -16.24,-3.8
Mechanical 15:
  lines w0.1: -16.256,4.82 -16.256,11.2 16.256,11.2 16.256,4.82
  lines w0.102: -1.905,0 1.905,0 ; 0,-2.54 0,2.54
3D body "1755778.stp": height 12.02, standoff -3.88, extent -16.24,-3.8 16.24,4.8

## CN_TECONN_1-5177986-4 [mm] "100pin 0.8mm Pitch Stacking Height 6.6mm Header-Stacking Connector male"
height 6.6
pads (102):
  rect 0.5x2 smd: 1(-19.6,2.2) 2(-19.6,-2.2) 3(-18.8,2.2) 4(-18.8,-2.2) 5(-18,2.2) 6(-18,-2.2) 7(-17.2,2.2) 8(-17.2,-2.2) 9(-16.4,2.2) 10(-16.4,-2.2) 11(-15.6,2.2) 12(-15.6,-2.2) 13(-14.8,2.2) 14(-14.8,-2.2) 15(-14,2.2) 16(-14,-2.2) 17(-13.2,2.2) 18(-13.2,-2.2) 19(-12.4,2.2) 20(-12.4,-2.2) 21(-11.6,2.2) 22(-11.6,-2.2) 23(-10.8,2.2) 24(-10.8,-2.2) 25(-10,2.2) 26(-10,-2.2) 27(-9.2,2.2) 28(-9.2,-2.2) 29(-8.4,2.2) 30(-8.4,-2.2) 31(-7.6,2.2) 32(-7.6,-2.2) 33(-6.8,2.2) 34(-6.8,-2.2) 35(-6,2.2) 36(-6,-2.2) 37(-5.2,2.2) 38(-5.2,-2.2) 39(-4.4,2.2) 40(-4.4,-2.2) 41(-3.6,2.2) 42(-3.6,-2.2) 43(-2.8,2.2) 44(-2.8,-2.2) 45(-2,2.2) 46(-2,-2.2) 47(-1.2,2.2) 48(-1.2,-2.2) 49(-0.4,2.2) 50(-0.4,-2.2) 51(0.4,2.2) 52(0.4,-2.2) 53(1.2,2.2) 54(1.2,-2.2) 55(2,2.2) 56(2,-2.2) 57(2.8,2.2) 58(2.8,-2.2) 59(3.6,2.2) 60(3.6,-2.2) 61(4.4,2.2) 62(4.4,-2.2) 63(5.2,2.2) 64(5.2,-2.2) 65(6,2.2) 66(6,-2.2) 67(6.8,2.2) 68(6.8,-2.2) 69(7.6,2.2) 70(7.6,-2.2) 71(8.4,2.2) 72(8.4,-2.2) 73(9.2,2.2) 74(9.2,-2.2) 75(10,2.2) 76(10,-2.2) 77(10.8,2.2) 78(10.8,-2.2) 79(11.6,2.2) 80(11.6,-2.2) 81(12.4,2.2) 82(12.4,-2.2) 83(13.2,2.2) 84(13.2,-2.2) 85(14,2.2) 86(14,-2.2) 87(14.8,2.2) 88(14.8,-2.2) 89(15.6,2.2) 90(15.6,-2.2) 91(16.4,2.2) 92(16.4,-2.2) 93(17.2,2.2) 94(17.2,-2.2) 95(18,2.2) 96(18,-2.2) 97(18.8,2.2) 98(18.8,-2.2) 99(19.6,2.2) 100(19.6,-2.2)
  round 0.79 hole 0.8 unplated: MH1(-22.1,0)
  round 1.19 hole 1.2 unplated: MH2(22.1,0)
Top Overlay:
  circle w0.178: c-20.274,2.8 r0.074
Mechanical 13:
  circle w0.381: c-20.05,1.375 r0.125
  lines w0.1: -22.9,-2.1 ccw(c-22.5,-2.1) -22.5,-2.5 22.5,-2.5 ccw(c22.5,-2.1) 22.9,-2.1 ; -22.9,2.1 cw(c-22.5,2.1) -22.5,2.5 22.5,2.5 cw(c22.5,2.1) 22.9,2.1 ; -22.5,-3 -20.6,-3 -20.6,-2.5 ; -22.5,-3 cw(c-22.5,-2.6) -22.9,-2.6 -22.9,2.6 cw(c-22.5,2.6) -22.5,3 -20.6,3 -20.6,2.5 ; -22.075,-1.9 22.075,-1.9 ; -21.4,1.9 21.4,1.9 ; 20.4,-0.525 20.4,0.525 -20.4,0.525 -20.4,-0.525 20.4,-0.525 ; 20.6,-2.5 20.6,-3.001 22.5,-3.001 ccw(c22.5,-2.601) 22.9,-2.601 22.9,2.6 ccw(c22.5,2.6) 22.5,3 20.6,3 20.6,2.5
  lines w0.102: -22.075,-1.9 -22.075,0 -21.4,0 -21.4,1.9 ; 21.4,1.9 21.4,0 22.075,0 22.075,-1.9
Mechanical 15:
  lines w0.102: 0,-0.5 0,0.5 ; -19.1,-3.5 19.1,-3.5 19.1,3.5 -19.1,3.5 -19.1,-3.5
3D body "c-1-5177986-4-d-3d.stp": height 5.62, standoff -0.98, extent -22.9,-3 22.9,3

## CN_TECONN_2-5177986-3 [mm] "0.8mm Pitch Stacking Height 6.6mm Header-Stacking Connector male"
height 6.6
pads (82):
  rect 0.5x2 smd: 1(-15.6,2.2) 2(-15.6,-2.2) 3(-14.8,2.2) 4(-14.8,-2.2) 5(-14,2.2) 6(-14,-2.2) 7(-13.2,2.2) 8(-13.2,-2.2) 9(-12.4,2.2) 10(-12.4,-2.2) 11(-11.6,2.2) 12(-11.6,-2.2) 13(-10.8,2.2) 14(-10.8,-2.2) 15(-10,2.2) 16(-10,-2.2) 17(-9.2,2.2) 18(-9.2,-2.2) 19(-8.4,2.2) 20(-8.4,-2.2) 21(-7.6,2.2) 22(-7.6,-2.2) 23(-6.8,2.2) 24(-6.8,-2.2) 25(-6,2.2) 26(-6,-2.2) 27(-5.2,2.2) 28(-5.2,-2.2) 29(-4.4,2.2) 30(-4.4,-2.2) 31(-3.6,2.2) 32(-3.6,-2.2) 33(-2.8,2.2) 34(-2.8,-2.2) 35(-2,2.2) 36(-2,-2.2) 37(-1.2,2.2) 38(-1.2,-2.2) 39(-0.4,2.2) 40(-0.4,-2.2) 41(0.4,2.2) 42(0.4,-2.2) 43(1.2,2.2) 44(1.2,-2.2) 45(2,2.2) 46(2,-2.2) 47(2.8,2.2) 48(2.8,-2.2) 49(3.6,2.2) 50(3.6,-2.2) 51(4.4,2.2) 52(4.4,-2.2) 53(5.2,2.2) 54(5.2,-2.2) 55(6,2.2) 56(6,-2.2) 57(6.8,2.2) 58(6.8,-2.2) 59(7.6,2.2) 60(7.6,-2.2) 61(8.4,2.2) 62(8.4,-2.2) 63(9.2,2.2) 64(9.2,-2.2) 65(10,2.2) 66(10,-2.2) 67(10.8,2.2) 68(10.8,-2.2) 69(11.6,2.2) 70(11.6,-2.2) 71(12.4,2.2) 72(12.4,-2.2) 73(13.2,2.2) 74(13.2,-2.2) 75(14,2.2) 76(14,-2.2) 77(14.8,2.2) 78(14.8,-2.2) 79(15.6,2.2) 80(15.6,-2.2)
  round 0.79 hole 0.8 unplated: MH1(-18.1,0)
  round 1.19 hole 1.2 unplated: MH2(18.1,0)
Top Overlay:
  circle w0.178: c-16.249,2.475 r0.074
Mechanical 13:
  circle w0.381: c-16.05,1.375 r0.125
  lines w0.1: -18.9,-2.1 ccw(c-18.5,-2.1) -18.5,-2.5 18.5,-2.5 ; -18.9,2.1 cw(c-18.5,2.1) -18.5,2.5 18.5,2.5 cw(c18.5,2.1) 18.9,2.1 ; -18.075,-1.9 18.075,-1.9 ; -17.4,1.9 17.4,1.9 ; -16.6,-2.5 -16.6,-3 -18.5,-3 cw(c-18.5,-2.6) -18.9,-2.6 -18.9,2.6 cw(c-18.5,2.6) -18.5,3 -16.6,3 -16.6,2.5 ; 16.4,-0.525 16.4,0.525 -16.4,0.525 -16.4,-0.525 16.4,-0.525 ; 16.6,-2.5 16.6,-3.001 18.5,-3.001 ccw(c18.5,-2.6) 18.9,-2.6 18.9,2.6 ccw(c18.5,2.6) 18.5,3 16.6,3 16.6,2.5 ; 18.5,-2.5 ccw(c18.5,-2.1) 18.9,-2.1
  lines w0.102: -18.075,-1.9 -18.075,0 -17.4,0 -17.4,1.9 ; 17.4,1.9 17.4,0 18.075,0 18.075,-1.9
Mechanical 15:
  lines w0.102: 0,-0.5 0,0.5 ; -19.1,-3.5 -19.1,3.5 19.1,3.5 19.1,-3.5 -19.1,-3.5
3D body "c-2-5177986-3-d-3d.stp": height 6.62, standoff -0.98, extent -18.9,-3 18.9,3

## CN_TECONN_2-5177986-4 [mm] "100pin 0.8mm Pitch Stacking Height 6.6mm Header-Stacking Connector male"
height 6.6
pads (102):
  rect 0.5x2 smd: 1(-19.6,2.2) 2(-19.6,-2.2) 3(-18.8,2.2) 4(-18.8,-2.2) 5(-18,2.2) 6(-18,-2.2) 7(-17.2,2.2) 8(-17.2,-2.2) 9(-16.4,2.2) 10(-16.4,-2.2) 11(-15.6,2.2) 12(-15.6,-2.2) 13(-14.8,2.2) 14(-14.8,-2.2) 15(-14,2.2) 16(-14,-2.2) 17(-13.2,2.2) 18(-13.2,-2.2) 19(-12.4,2.2) 20(-12.4,-2.2) 21(-11.6,2.2) 22(-11.6,-2.2) 23(-10.8,2.2) 24(-10.8,-2.2) 25(-10,2.2) 26(-10,-2.2) 27(-9.2,2.2) 28(-9.2,-2.2) 29(-8.4,2.2) 30(-8.4,-2.2) 31(-7.6,2.2) 32(-7.6,-2.2) 33(-6.8,2.2) 34(-6.8,-2.2) 35(-6,2.2) 36(-6,-2.2) 37(-5.2,2.2) 38(-5.2,-2.2) 39(-4.4,2.2) 40(-4.4,-2.2) 41(-3.6,2.2) 42(-3.6,-2.2) 43(-2.8,2.2) 44(-2.8,-2.2) 45(-2,2.2) 46(-2,-2.2) 47(-1.2,2.2) 48(-1.2,-2.2) 49(-0.4,2.2) 50(-0.4,-2.2) 51(0.4,2.2) 52(0.4,-2.2) 53(1.2,2.2) 54(1.2,-2.2) 55(2,2.2) 56(2,-2.2) 57(2.8,2.2) 58(2.8,-2.2) 59(3.6,2.2) 60(3.6,-2.2) 61(4.4,2.2) 62(4.4,-2.2) 63(5.2,2.2) 64(5.2,-2.2) 65(6,2.2) 66(6,-2.2) 67(6.8,2.2) 68(6.8,-2.2) 69(7.6,2.2) 70(7.6,-2.2) 71(8.4,2.2) 72(8.4,-2.2) 73(9.2,2.2) 74(9.2,-2.2) 75(10,2.2) 76(10,-2.2) 77(10.8,2.2) 78(10.8,-2.2) 79(11.6,2.2) 80(11.6,-2.2) 81(12.4,2.2) 82(12.4,-2.2) 83(13.2,2.2) 84(13.2,-2.2) 85(14,2.2) 86(14,-2.2) 87(14.8,2.2) 88(14.8,-2.2) 89(15.6,2.2) 90(15.6,-2.2) 91(16.4,2.2) 92(16.4,-2.2) 93(17.2,2.2) 94(17.2,-2.2) 95(18,2.2) 96(18,-2.2) 97(18.8,2.2) 98(18.8,-2.2) 99(19.6,2.2) 100(19.6,-2.2)
  round 0.79 hole 0.8 unplated: MH1(-22.1,0)
  round 1.19 hole 1.2 unplated: MH2(22.1,0)
Top Overlay:
  circle w0.178: c-20.274,2.8 r0.074
Mechanical 13:
  circle w0.381: c-20.05,1.375 r0.125
  lines w0.1: -22.9,-2.1 ccw(c-22.5,-2.1) -22.5,-2.5 22.5,-2.5 ccw(c22.5,-2.1) 22.9,-2.1 ; -22.9,2.1 cw(c-22.5,2.1) -22.5,2.5 22.5,2.5 cw(c22.5,2.1) 22.9,2.1 ; -22.5,-3 -20.6,-3 -20.6,-2.5 ; -22.5,-3 cw(c-22.5,-2.6) -22.9,-2.6 -22.9,2.6 cw(c-22.5,2.6) -22.5,3 -20.6,3 -20.6,2.5 ; -22.075,-1.9 22.075,-1.9 ; -21.4,1.9 21.4,1.9 ; 20.4,-0.525 20.4,0.525 -20.4,0.525 -20.4,-0.525 20.4,-0.525 ; 20.6,-2.5 20.6,-3.001 22.5,-3.001 ccw(c22.5,-2.601) 22.9,-2.601 22.9,2.6 ccw(c22.5,2.6) 22.5,3 20.6,3 20.6,2.5
  lines w0.102: -22.075,-1.9 -22.075,0 -21.4,0 -21.4,1.9 ; 21.4,1.9 21.4,0 22.075,0 22.075,-1.9
Mechanical 15:
  lines w0.102: 0,-0.5 0,0.5 ; -19.1,-3.5 19.1,-3.5 19.1,3.5 -19.1,3.5 -19.1,-3.5
3D body "c-2-5177986-4-d-3d.stp": height 6.62, standoff -0.98, extent -22.9,-3 22.9,3